# Altium footprint library Molex FFC - FPC Connectors (SMT).PcbLib: 638 footprints (part 20 of 40)
Each footprint in its own frame and in the unit in brackets; x right, y up, seen from the top. Pads: shape width x height; smd on the part's side, far side on the other; paste and mask are expansions set on the pad; w line width, h text height; cw(c..) or ccw(c..) is an arc to the next point about the centre after c.
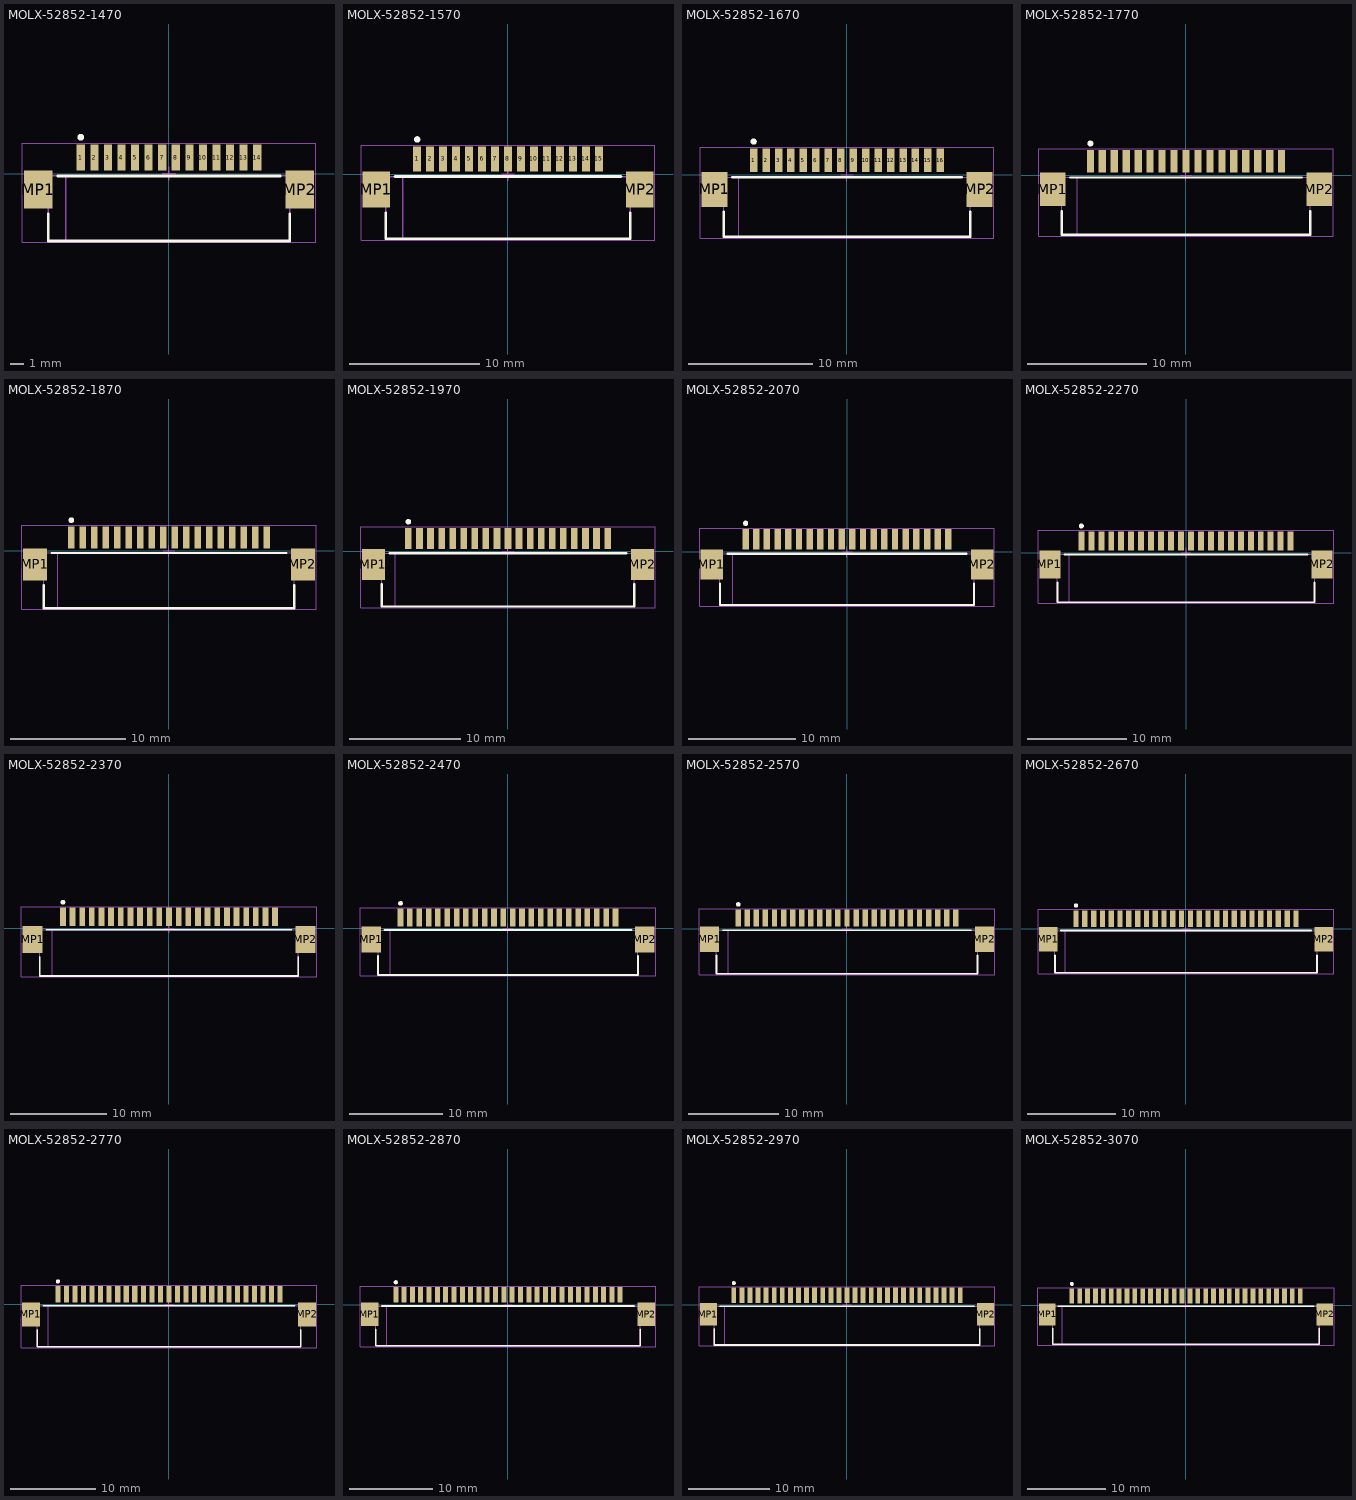
[diagram p19: the footprints below, top view; thin cyan lines are the x and y axes]

## MOLX-52852-1470 [mm] "FFC Connector, 14-Leads, Right Angle, Pitch 1.0 mm, Mated Height 3.1 mm, SMT"
height 3.1
pads (16):
  rect 0.6x1.9 smd: 1(-6.5,1.175) 2(-5.5,1.175) 3(-4.5,1.175) 4(-3.5,1.175) 5(-2.5,1.175) 6(-1.5,1.175) 7(-0.5,1.175) 8(0.5,1.175) 9(1.5,1.175) 10(2.5,1.175) 11(3.5,1.175) 12(4.5,1.175) 13(5.5,1.175) 14(6.5,1.175)
  rect 2.1x2.8 smd: MP1(-9.65,-1.175) MP2(9.65,-1.175)
Top Overlay:
  circle w0.25: c-6.5,2.675 r0.125
  lines w0.2: -8.9,-2.975 -8.9,-4.975 8.9,-4.975 8.9,-2.975 ; -8.2,-0.175 8.2,-0.175
Mechanical 13:
  lines w0.1: -7.614,-4.975 -7.614,-0.175 ; -8.9,-4.975 -8.9,-0.175 8.9,-0.175 8.9,-4.975 -8.9,-4.975
Mechanical 15:
  lines w0.05: -10.8,-5.075 -10.8,2.225 10.8,2.225 10.8,-5.075 -10.8,-5.075
  lines w0.1: -0.5,0 0.5,0 ; 0,-0.5 0,0.5
3D body: height 0.25, standoff 0, extent -10.15,-4.975 10.15,1.825

## MOLX-52852-1570 [mm] "FFC Connector, 15-Leads, Right Angle, Pitch 1.0 mm, Mated Height 3.1 mm, SMT"
height 3.1
pads (17):
  rect 0.6x1.9 smd: 1(-7,1.175) 2(-6,1.175) 3(-5,1.175) 4(-4,1.175) 5(-3,1.175) 6(-2,1.175) 7(-1,1.175) 8(0,1.175) 9(1,1.175) 10(2,1.175) 11(3,1.175) 12(4,1.175) 13(5,1.175) 14(6,1.175) 15(7,1.175)
  rect 2.1x2.8 smd: MP1(-10.15,-1.175) MP2(10.15,-1.175)
Top Overlay:
  circle w0.25: c-7,2.675 r0.125
  lines w0.2: -9.4,-2.975 -9.4,-4.975 9.4,-4.975 9.4,-2.975 ; -8.7,-0.175 8.7,-0.175
Mechanical 13:
  lines w0.1: -8.114,-4.975 -8.114,-0.175 ; -9.4,-4.975 9.4,-4.975 9.4,-0.175 -9.4,-0.175 -9.4,-4.975
Mechanical 15:
  lines w0.05: -11.3,-5.075 11.3,-5.075 11.3,2.225 -11.3,2.225 -11.3,-5.075
  lines w0.1: -0.5,0 0.5,0 ; 0,-0.5 0,0.5
3D body: height 0.25, standoff 0, extent -10.65,-4.975 10.65,1.825

## MOLX-52852-1670 [mm] "FFC Connector, 16-Leads, Right Angle, Pitch 1.0 mm, Mated Height 3.1 mm, SMT"
height 3.1
pads (18):
  rect 0.6x1.9 smd: 1(-7.5,1.175) 2(-6.5,1.175) 3(-5.5,1.175) 4(-4.5,1.175) 5(-3.5,1.175) 6(-2.5,1.175) 7(-1.5,1.175) 8(-0.5,1.175) 9(0.5,1.175) 10(1.5,1.175) 11(2.5,1.175) 12(3.5,1.175) 13(4.5,1.175) 14(5.5,1.175) 15(6.5,1.175) 16(7.5,1.175)
  rect 2.1x2.8 smd: MP1(-10.65,-1.175) MP2(10.65,-1.175)
Top Overlay:
  circle w0.25: c-7.5,2.675 r0.125
  lines w0.2: -9.9,-2.975 -9.9,-4.975 9.9,-4.975 9.9,-2.975 ; -9.2,-0.175 9.2,-0.175
Mechanical 13:
  lines w0.1: -8.7,-4.975 -8.7,-0.175 ; -9.9,-4.975 -9.9,-0.175 9.9,-0.175 9.9,-4.975 -9.9,-4.975
Mechanical 15:
  lines w0.05: -11.8,-5.075 -11.8,2.225 11.8,2.225 11.8,-5.075 -11.8,-5.075
  lines w0.1: -0.5,0 0.5,0 ; 0,-0.5 0,0.5
3D body: height 0.25, standoff 0, extent -11.15,-4.975 11.15,1.825

## MOLX-52852-1770 [mm] "FFC Connector, 17-Leads, Right Angle, Pitch 1.0 mm, Mated Height 3.1 mm, SMT"
height 3.1
pads (19):
  rect 0.6x1.9 smd: 1(-8,1.175) 2(-7,1.175) 3(-6,1.175) 4(-5,1.175) 5(-4,1.175) 6(-3,1.175) 7(-2,1.175) 8(-1,1.175) 9(0,1.175) 10(1,1.175) 11(2,1.175) 12(3,1.175) 13(4,1.175) 14(5,1.175) 15(6,1.175) 16(7,1.175) 17(8,1.175)
  rect 2.1x2.8 smd: MP1(-11.15,-1.175) MP2(11.15,-1.175)
Top Overlay:
  circle w0.25: c-8,2.675 r0.125
  lines w0.2: -10.4,-2.975 -10.4,-4.975 10.4,-4.975 10.4,-2.975 ; -9.7,-0.175 9.7,-0.175
Mechanical 13:
  lines w0.1: -9.114,-4.975 -9.114,-0.175 ; -10.4,-4.975 -10.4,-0.175 10.4,-0.175 10.4,-4.975 -10.4,-4.975
Mechanical 15:
  lines w0.05: -12.3,-5.075 -12.3,2.225 12.3,2.225 12.3,-5.075 -12.3,-5.075
  lines w0.1: -0.5,0 0.5,0 ; 0,-0.5 0,0.5
3D body: height 0.25, standoff 0, extent -11.65,-4.975 11.65,1.825

## MOLX-52852-1870 [mm] "FFC Connector, 18-Leads, Right Angle, Pitch 1.0 mm, Mated Height 3.1 mm, SMT"
height 3.1
pads (20):
  rect 0.6x1.9 smd: 1(-8.5,1.175) 2(-7.5,1.175) 3(-6.5,1.175) 4(-5.5,1.175) 5(-4.5,1.175) 6(-3.5,1.175) 7(-2.5,1.175) 8(-1.5,1.175) 9(-0.5,1.175) 10(0.5,1.175) 11(1.5,1.175) 12(2.5,1.175) 13(3.5,1.175) 14(4.5,1.175) 15(5.5,1.175) 16(6.5,1.175) 17(7.5,1.175) 18(8.5,1.175)
  rect 2.1x2.8 smd: MP1(-11.65,-1.175) MP2(11.65,-1.175)
Top Overlay:
  circle w0.25: c-8.5,2.675 r0.125
  lines w0.2: -10.9,-2.975 -10.9,-4.975 10.9,-4.975 10.9,-2.975 ; -10.2,-0.175 10.2,-0.175
Mechanical 13:
  lines w0.1: -9.7,-4.975 -9.7,-0.175 ; -10.9,-4.975 10.9,-4.975 10.9,-0.175 -10.9,-0.175 -10.9,-4.975
Mechanical 15:
  lines w0.05: -12.8,-5.075 12.8,-5.075 12.8,2.225 -12.8,2.225 -12.8,-5.075
  lines w0.1: -0.5,0 0.5,0 ; 0,-0.5 0,0.5
3D body: height 0.25, standoff 0, extent -12.15,-4.975 12.15,1.825

## MOLX-52852-1970 [mm] "FFC Connector, 19-Leads, Right Angle, Pitch 1.0 mm, Mated Height 3.1 mm, SMT"
height 3.1
pads (21):
  rect 0.6x1.9 smd: 1(-9,1.175) 2(-8,1.175) 3(-7,1.175) 4(-6,1.175) 5(-5,1.175) 6(-4,1.175) 7(-3,1.175) 8(-2,1.175) 9(-1,1.175) 10(0,1.175) 11(1,1.175) 12(2,1.175) 13(3,1.175) 14(4,1.175) 15(5,1.175) 16(6,1.175) 17(7,1.175) 18(8,1.175) 19(9,1.175)
  rect 2.1x2.8 smd: MP1(-12.15,-1.175) MP2(12.15,-1.175)
Top Overlay:
  circle w0.25: c-9,2.675 r0.125
  lines w0.2: -11.4,-2.975 -11.4,-4.975 11.4,-4.975 11.4,-2.975 ; -10.7,-0.175 10.7,-0.175
Mechanical 13:
  lines w0.1: -10.2,-4.975 -10.2,-0.175 ; -11.4,-4.975 -11.4,-0.175 11.4,-0.175 11.4,-4.975 -11.4,-4.975
Mechanical 15:
  lines w0.05: -13.3,-5.075 -13.3,2.225 13.3,2.225 13.3,-5.075 -13.3,-5.075
  lines w0.1: -0.5,0 0.5,0 ; 0,-0.5 0,0.5
3D body: height 0.25, standoff 0, extent -12.65,-4.975 12.65,1.825

## MOLX-52852-2070 [mm] "FFC Connector, 20-Leads, Right Angle, Pitch 1.0 mm, Mated Height 3.1 mm, SMT"
height 3.1
pads (22):
  rect 0.6x1.9 smd: 1(-9.5,1.175) 2(-8.5,1.175) 3(-7.5,1.175) 4(-6.5,1.175) 5(-5.5,1.175) 6(-4.5,1.175) 7(-3.5,1.175) 8(-2.5,1.175) 9(-1.5,1.175) 10(-0.5,1.175) 11(0.5,1.175) 12(1.5,1.175) 13(2.5,1.175) 14(3.5,1.175) 15(4.5,1.175) 16(5.5,1.175) 17(6.5,1.175) 18(7.5,1.175) 19(8.5,1.175) 20(9.5,1.175)
  rect 2.1x2.8 smd: MP1(-12.65,-1.175) MP2(12.65,-1.175)
Top Overlay:
  circle w0.25: c-9.5,2.675 r0.125
  lines w0.2: -11.9,-2.975 -11.9,-4.975 11.9,-4.975 11.9,-2.975 ; -11.2,-0.175 11.2,-0.175
Mechanical 13:
  lines w0.1: -10.7,-4.975 -10.7,-0.175 ; -11.9,-4.975 -11.9,-0.175 11.9,-0.175 11.9,-4.975 -11.9,-4.975
Mechanical 15:
  lines w0.05: -13.8,-5.075 -13.8,2.225 13.8,2.225 13.8,-5.075 -13.8,-5.075
  lines w0.1: -0.5,0 0.5,0 ; 0,-0.5 0,0.5
3D body: height 0.25, standoff 0, extent -13.15,-4.975 13.15,1.825

## MOLX-52852-2270 [mm] "FFC Connector, 22-Leads, Right Angle, Pitch 1.0 mm, Mated Height 3.1 mm, SMT"
height 3.1
pads (24):
  rect 0.6x1.9 smd: 1(-10.5,1.175) 2(-9.5,1.175) 3(-8.5,1.175) 4(-7.5,1.175) 5(-6.5,1.175) 6(-5.5,1.175) 7(-4.5,1.175) 8(-3.5,1.175) 9(-2.5,1.175) 10(-1.5,1.175) 11(-0.5,1.175) 12(0.5,1.175) 13(1.5,1.175) 14(2.5,1.175) 15(3.5,1.175) 16(4.5,1.175) 17(5.5,1.175) 18(6.5,1.175) 19(7.5,1.175) 20(8.5,1.175) 21(9.5,1.175) 22(10.5,1.175)
  rect 2.1x2.8 smd: MP1(-13.65,-1.175) MP2(13.65,-1.175)
Top Overlay:
  circle w0.25: c-10.5,2.675 r0.125
  lines w0.2: -12.9,-2.975 -12.9,-4.975 12.9,-4.975 12.9,-2.975 ; -12.2,-0.175 12.2,-0.175
Mechanical 13:
  lines w0.1: -11.7,-4.975 -11.7,-0.175 ; -12.9,-4.975 -12.9,-0.175 12.9,-0.175 12.9,-4.975 -12.9,-4.975
Mechanical 15:
  lines w0.05: -14.8,-5.075 -14.8,2.225 14.8,2.225 14.8,-5.075 -14.8,-5.075
  lines w0.1: -0.5,0 0.5,0 ; 0,-0.5 0,0.5
3D body: height 0.25, standoff 0, extent -14.15,-4.975 14.15,1.825

## MOLX-52852-2370 [mm] "FFC Connector, 23-Leads, Right Angle, Pitch 1.0 mm, Mated Height 3.1 mm, SMT"
height 3.1
pads (25):
  rect 0.6x1.9 smd: 1(-11,1.175) 2(-10,1.175) 3(-9,1.175) 4(-8,1.175) 5(-7,1.175) 6(-6,1.175) 7(-5,1.175) 8(-4,1.175) 9(-3,1.175) 10(-2,1.175) 11(-1,1.175) 12(0,1.175) 13(1,1.175) 14(2,1.175) 15(3,1.175) 16(4,1.175) 17(5,1.175) 18(6,1.175) 19(7,1.175) 20(8,1.175) 21(9,1.175) 22(10,1.175) 23(11,1.175)
  rect 2.1x2.8 smd: MP1(-14.15,-1.175) MP2(14.15,-1.175)
Top Overlay:
  circle w0.25: c-11,2.675 r0.125
  lines w0.2: -13.4,-2.975 -13.4,-4.975 13.4,-4.975 13.4,-2.975 ; -12.7,-0.175 12.7,-0.175
Mechanical 13:
  lines w0.1: -12.114,-4.975 -12.114,-0.175 ; -13.4,-4.975 13.4,-4.975 13.4,-0.175 -13.4,-0.175 -13.4,-4.975
Mechanical 15:
  lines w0.05: -15.3,-5.075 15.3,-5.075 15.3,2.225 -15.3,2.225 -15.3,-5.075
  lines w0.1: -0.5,0 0.5,0 ; 0,-0.5 0,0.5
3D body: height 0.25, standoff 0, extent -14.65,-4.975 14.65,1.825

## MOLX-52852-2470 [mm] "FFC Connector, 24-Leads, Right Angle, Pitch 1.0 mm, Mated Height 3.1 mm, SMT"
height 3.1
pads (26):
  rect 0.6x1.9 smd: 1(-11.5,1.175) 2(-10.5,1.175) 3(-9.5,1.175) 4(-8.5,1.175) 5(-7.5,1.175) 6(-6.5,1.175) 7(-5.5,1.175) 8(-4.5,1.175) 9(-3.5,1.175) 10(-2.5,1.175) 11(-1.5,1.175) 12(-0.5,1.175) 13(0.5,1.175) 14(1.5,1.175) 15(2.5,1.175) 16(3.5,1.175) 17(4.5,1.175) 18(5.5,1.175) 19(6.5,1.175) 20(7.5,1.175) 21(8.5,1.175) 22(9.5,1.175) 23(10.5,1.175) 24(11.5,1.175)
  rect 2.1x2.8 smd: MP1(-14.65,-1.175) MP2(14.65,-1.175)
Top Overlay:
  circle w0.25: c-11.5,2.675 r0.125
  lines w0.2: -13.9,-2.975 -13.9,-4.975 13.9,-4.975 13.9,-2.975 ; -13.2,-0.175 13.2,-0.175
Mechanical 13:
  lines w0.1: -12.614,-4.975 -12.614,-0.175 ; -13.9,-4.975 13.9,-4.975 13.9,-0.175 -13.9,-0.175 -13.9,-4.975
Mechanical 15:
  lines w0.05: -15.8,-5.075 15.8,-5.075 15.8,2.225 -15.8,2.225 -15.8,-5.075
  lines w0.1: -0.5,0 0.5,0 ; 0,-0.5 0,0.5
3D body: height 0.25, standoff 0, extent -15.15,-4.975 15.15,1.825

## MOLX-52852-2570 [mm] "FFC Connector, 25-Leads, Right Angle, Pitch 1.0 mm, Mated Height 3.1 mm, SMT"
height 3.1
pads (27):
  rect 0.6x1.9 smd: 1(-12,1.175) 2(-11,1.175) 3(-10,1.175) 4(-9,1.175) 5(-8,1.175) 6(-7,1.175) 7(-6,1.175) 8(-5,1.175) 9(-4,1.175) 10(-3,1.175) 11(-2,1.175) 12(-1,1.175) 13(0,1.175) 14(1,1.175) 15(2,1.175) 16(3,1.175) 17(4,1.175) 18(5,1.175) 19(6,1.175) 20(7,1.175) 21(8,1.175) 22(9,1.175) 23(10,1.175) 24(11,1.175) 25(12,1.175)
  rect 2.1x2.8 smd: MP1(-15.15,-1.175) MP2(15.15,-1.175)
Top Overlay:
  circle w0.25: c-12,2.675 r0.125
  lines w0.2: -14.4,-2.975 -14.4,-4.975 14.4,-4.975 14.4,-2.975 ; -13.7,-0.175 13.7,-0.175
Mechanical 13:
  lines w0.1: -13.114,-4.975 -13.114,-0.175 ; -14.4,-4.975 14.4,-4.975 14.4,-0.175 -14.4,-0.175 -14.4,-4.975
Mechanical 15:
  lines w0.05: -16.3,-5.075 16.3,-5.075 16.3,2.225 -16.3,2.225 -16.3,-5.075
  lines w0.1: -0.5,0 0.5,0 ; 0,-0.5 0,0.5
3D body: height 0.25, standoff 0, extent -15.65,-4.975 15.65,1.825

## MOLX-52852-2670 [mm] "FFC Connector, 26-Leads, Right Angle, Pitch 1.0 mm, Mated Height 3.1 mm, SMT"
height 3.1
pads (28):
  rect 0.6x1.9 smd: 1(-12.5,1.175) 2(-11.5,1.175) 3(-10.5,1.175) 4(-9.5,1.175) 5(-8.5,1.175) 6(-7.5,1.175) 7(-6.5,1.175) 8(-5.5,1.175) 9(-4.5,1.175) 10(-3.5,1.175) 11(-2.5,1.175) 12(-1.5,1.175) 13(-0.5,1.175) 14(0.5,1.175) 15(1.5,1.175) 16(2.5,1.175) 17(3.5,1.175) 18(4.5,1.175) 19(5.5,1.175) 20(6.5,1.175) 21(7.5,1.175) 22(8.5,1.175) 23(9.5,1.175) 24(10.5,1.175) 25(11.5,1.175) 26(12.5,1.175)
  rect 2.1x2.8 smd: MP1(-15.65,-1.175) MP2(15.65,-1.175)
Top Overlay:
  circle w0.25: c-12.5,2.675 r0.125
  lines w0.2: -14.9,-2.975 -14.9,-4.975 14.9,-4.975 14.9,-2.975 ; -14.2,-0.175 14.2,-0.175
Mechanical 13:
  lines w0.1: -13.7,-4.975 -13.7,-0.175 ; -14.9,-4.975 -14.9,-0.175 14.9,-0.175 14.9,-4.975 -14.9,-4.975
Mechanical 15:
  lines w0.05: -16.8,-5.075 -16.8,2.225 16.8,2.225 16.8,-5.075 -16.8,-5.075
  lines w0.1: -0.5,0 0.5,0 ; 0,-0.5 0,0.5
3D body: height 0.25, standoff 0, extent -16.15,-4.975 16.15,1.825

## MOLX-52852-2770 [mm] "FFC Connector, 27-Leads, Right Angle, Pitch 1.0 mm, Mated Height 3.1 mm, SMT"
height 3.1
pads (29):
  rect 0.6x1.9 smd: 1(-13,1.175) 2(-12,1.175) 3(-11,1.175) 4(-10,1.175) 5(-9,1.175) 6(-8,1.175) 7(-7,1.175) 8(-6,1.175) 9(-5,1.175) 10(-4,1.175) 11(-3,1.175) 12(-2,1.175) 13(-1,1.175) 14(0,1.175) 15(1,1.175) 16(2,1.175) 17(3,1.175) 18(4,1.175) 19(5,1.175) 20(6,1.175) 21(7,1.175) 22(8,1.175) 23(9,1.175) 24(10,1.175) 25(11,1.175) 26(12,1.175) 27(13,1.175)
  rect 2.1x2.8 smd: MP1(-16.15,-1.175) MP2(16.15,-1.175)
Top Overlay:
  circle w0.25: c-13,2.675 r0.125
  lines w0.2: -15.4,-2.975 -15.4,-4.975 15.4,-4.975 15.4,-2.975 ; -14.7,-0.175 14.7,-0.175
Mechanical 13:
  lines w0.1: -14.114,-4.975 -14.114,-0.175 ; -15.4,-4.975 15.4,-4.975 15.4,-0.175 -15.4,-0.175 -15.4,-4.975
Mechanical 15:
  lines w0.05: -17.3,-5.075 17.3,-5.075 17.3,2.225 -17.3,2.225 -17.3,-5.075
  lines w0.1: -0.5,0 0.5,0 ; 0,-0.5 0,0.5
3D body: height 0.25, standoff 0, extent -16.65,-4.975 16.65,1.825

## MOLX-52852-2870 [mm] "FFC Connector, 28-Leads, Right Angle, Pitch 1.0 mm, Mated Height 3.1 mm, SMT"
height 3.1
pads (30):
  rect 0.6x1.9 smd: 1(-13.5,1.175) 2(-12.5,1.175) 3(-11.5,1.175) 4(-10.5,1.175) 5(-9.5,1.175) 6(-8.5,1.175) 7(-7.5,1.175) 8(-6.5,1.175) 9(-5.5,1.175) 10(-4.5,1.175) 11(-3.5,1.175) 12(-2.5,1.175) 13(-1.5,1.175) 14(-0.5,1.175) 15(0.5,1.175) 16(1.5,1.175) 17(2.5,1.175) 18(3.5,1.175) 19(4.5,1.175) 20(5.5,1.175) 21(6.5,1.175) 22(7.5,1.175) 23(8.5,1.175) 24(9.5,1.175) 25(10.5,1.175) 26(11.5,1.175) 27(12.5,1.175) 28(13.5,1.175)
  rect 2.1x2.8 smd: MP1(-16.65,-1.175) MP2(16.65,-1.175)
Top Overlay:
  circle w0.25: c-13.5,2.675 r0.125
  lines w0.2: -15.9,-2.975 -15.9,-4.975 15.9,-4.975 15.9,-2.975 ; -15.2,-0.175 15.2,-0.175
Mechanical 13:
  lines w0.1: -14.614,-4.975 -14.614,-0.175 ; -15.9,-4.975 -15.9,-0.175 15.9,-0.175 15.9,-4.975 -15.9,-4.975
Mechanical 15:
  lines w0.05: -17.8,-5.075 -17.8,2.225 17.8,2.225 17.8,-5.075 -17.8,-5.075
  lines w0.1: -0.5,0 0.5,0 ; 0,-0.5 0,0.5
3D body: height 0.25, standoff 0, extent -17.15,-4.975 17.15,1.825

## MOLX-52852-2970 [mm] "FFC Connector, 29-Leads, Right Angle, Pitch 1.0 mm, Mated Height 3.1 mm, SMT"
height 3.1
pads (31):
  rect 0.6x1.9 smd: 1(-14,1.175) 2(-13,1.175) 3(-12,1.175) 4(-11,1.175) 5(-10,1.175) 6(-9,1.175) 7(-8,1.175) 8(-7,1.175) 9(-6,1.175) 10(-5,1.175) 11(-4,1.175) 12(-3,1.175) 13(-2,1.175) 14(-1,1.175) 15(0,1.175) 16(1,1.175) 17(2,1.175) 18(3,1.175) 19(4,1.175) 20(5,1.175) 21(6,1.175) 22(7,1.175) 23(8,1.175) 24(9,1.175) 25(10,1.175) 26(11,1.175) 27(12,1.175) 28(13,1.175) 29(14,1.175)
  rect 2.1x2.8 smd: MP1(-17.15,-1.175) MP2(17.15,-1.175)
Top Overlay:
  circle w0.25: c-14,2.675 r0.125
  lines w0.2: -16.4,-2.975 -16.4,-4.975 16.4,-4.975 16.4,-2.975 ; -15.7,-0.175 15.7,-0.175
Mechanical 13:
  lines w0.1: -15.114,-4.974 -15.114,-0.175 ; -16.4,-4.975 16.4,-4.975 16.4,-0.175 -16.4,-0.175 -16.4,-4.975
Mechanical 15:
  lines w0.05: -18.3,-5.075 18.3,-5.075 18.3,2.225 -18.3,2.225 -18.3,-5.075
  lines w0.1: -0.5,0 0.5,0 ; 0,-0.5 0,0.5
3D body: height 0.25, standoff 0, extent -17.65,-4.975 17.65,1.825

## MOLX-52852-3070 [mm] "FFC Connector, 30-Leads, Right Angle, Pitch 1.0 mm, Mated Height 3.1 mm, SMT"
height 3.1
pads (32):
  rect 0.6x1.9 smd: 1(-14.5,1.175) 2(-13.5,1.175) 3(-12.5,1.175) 4(-11.5,1.175) 5(-10.5,1.175) 6(-9.5,1.175) 7(-8.5,1.175) 8(-7.5,1.175) 9(-6.5,1.175) 10(-5.5,1.175) 11(-4.5,1.175) 12(-3.5,1.175) 13(-2.5,1.175) 14(-1.5,1.175) 15(-0.5,1.175) 16(0.5,1.175) 17(1.5,1.175) 18(2.5,1.175) 19(3.5,1.175) 20(4.5,1.175) 21(5.5,1.175) 22(6.5,1.175) 23(7.5,1.175) 24(8.5,1.175) 25(9.5,1.175) 26(10.5,1.175) 27(11.5,1.175) 28(12.5,1.175) 29(13.5,1.175) 30(14.5,1.175)
  rect 2.1x2.8 smd: MP1(-17.65,-1.175) MP2(17.65,-1.175)
Top Overlay:
  circle w0.25: c-14.5,2.675 r0.125
  lines w0.2: -16.9,-2.975 -16.9,-4.975 16.9,-4.975 16.9,-2.975 ; -16.2,-0.175 16.2,-0.175
Mechanical 13:
  lines w0.1: -15.7,-4.975 -15.7,-0.175 ; -16.9,-4.975 16.9,-4.975 16.9,-0.175 -16.9,-0.175 -16.9,-4.975
Mechanical 15:
  lines w0.05: -18.8,-5.075 18.8,-5.075 18.8,2.225 -18.8,2.225 -18.8,-5.075
  lines w0.1: -0.5,0 0.5,0 ; 0,-0.5 0,0.5
3D body: height 0.25, standoff 0, extent -18.15,-4.975 18.15,1.825